# Altium footprint library PCB_Library.PcbLib: 110 footprints (part 4 of 7)
Each footprint in its own frame and in the unit in brackets; x right, y up, seen from the top. Pads: shape width x height; smd on the part's side, far side on the other; paste and mask are expansions set on the pad; w line width, h text height; cw(c..) or ccw(c..) is an arc to the next point about the centre after c.
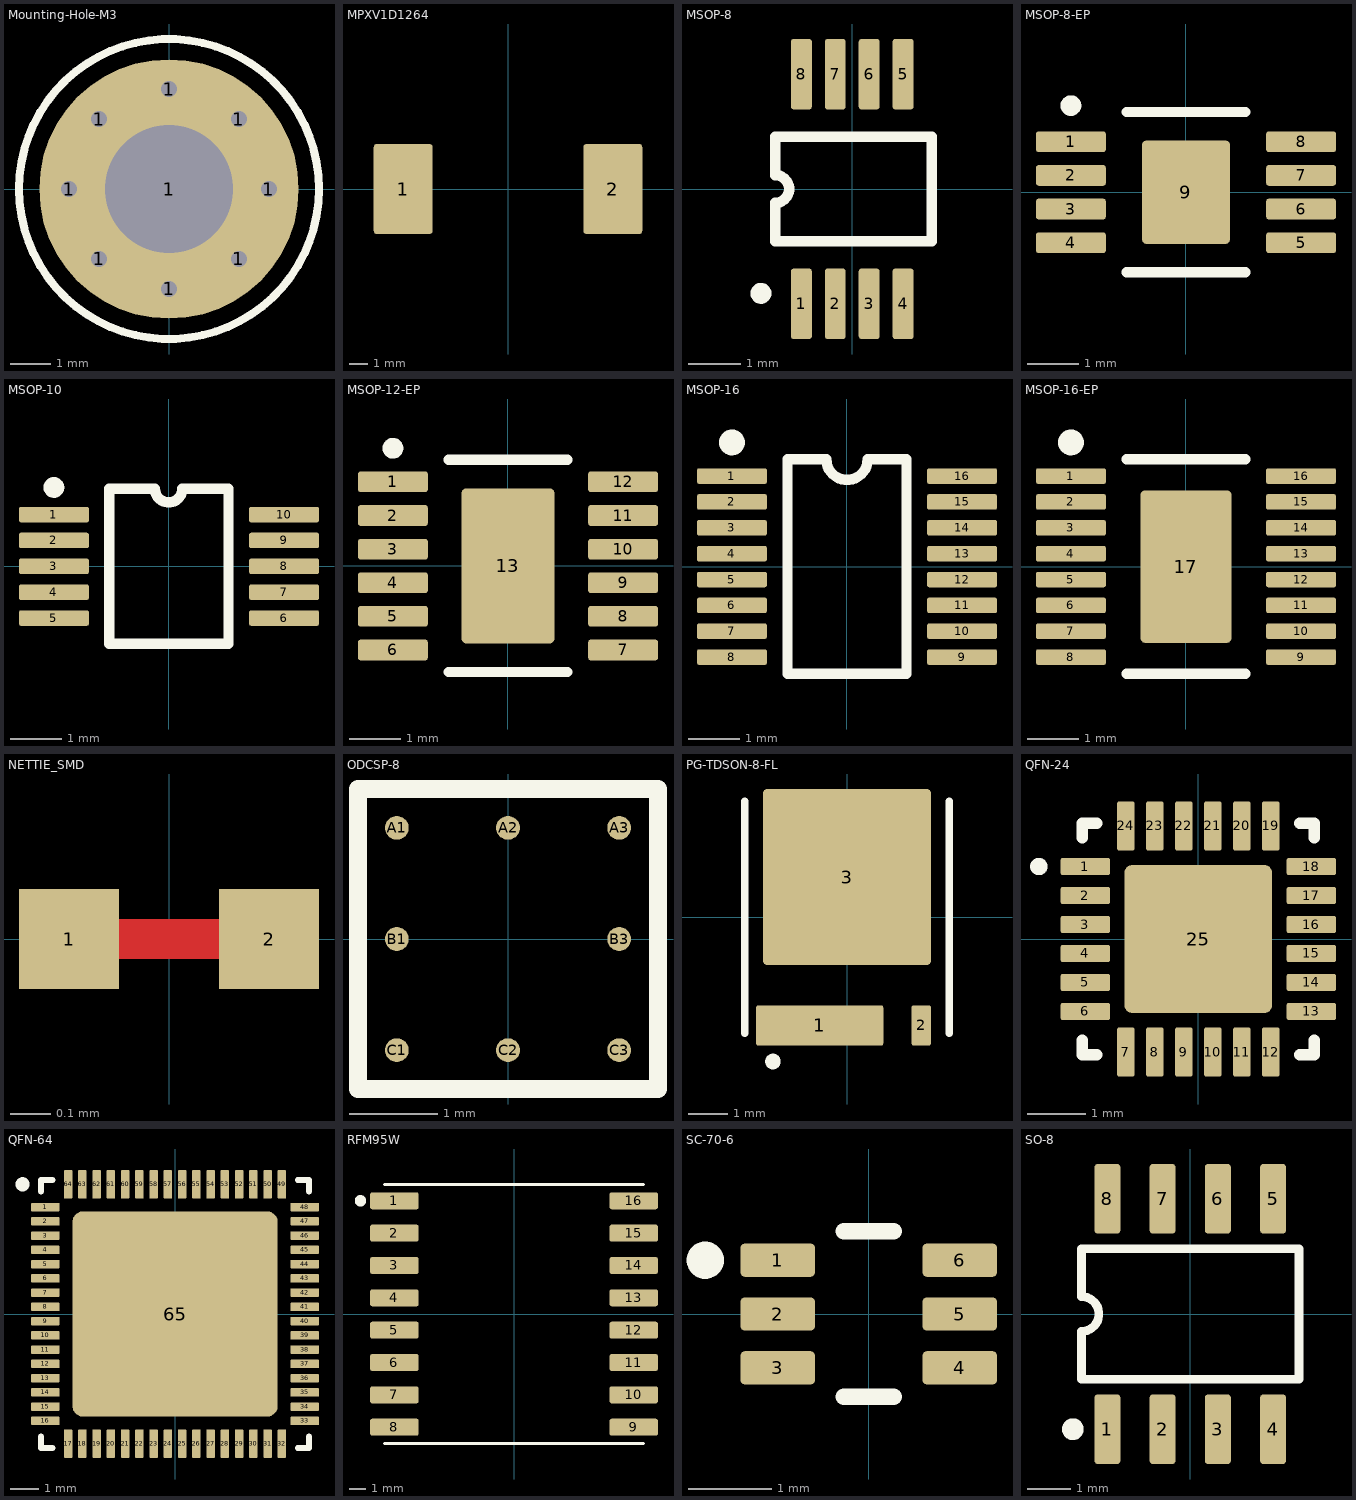
[diagram p3: the footprints below, top view; thin cyan lines are the x and y axes]

## Mounting-Hole-M3 [mm]
pads (9):
  round 1 hole 0.4 mask+0: 1(-2.5,0) 1(-1.75,-1.75) 1(-1.75,1.75) 1(0,-2.5) 1(0,2.5) 1(1.75,-1.75) 1(1.75,1.75) 1(2.5,0)
  round 6.5 hole 3.2 mask+0.05: 1(0,0)
Top Overlay:
  circle w0.2: c0,0 r3.758
Bottom Overlay:
  circle w0.2: c0,0 r3.758

## MPXV1D1264 [mil]
pads (2):
  rrect10% 127.01x195 smd paste-78.74 mask+2.95: 1(-226.5,0) 2(226.5,0)
Top Paste:
  rectangle: 177.17,-88.58 275.59,-19.68
  rectangle: 177.17,19.68 275.59,88.58
  rectangle: -275.59,-88.58 -177.17,-19.68
  rectangle: -275.59,19.68 -177.17,88.58
3D body "MPXV1D1264LR68.step": height 254.86, standoff 0.5, extent -267.72,-250 267.72,250

## MSOP-8 [mm]
pads (8):
  rrect25% 0.4x1.35 smd paste-0.05 mask+0.05: 1(-0.975,-2.2) 2(-0.325,-2.2) 3(0.325,-2.2) 4(0.975,-2.2) 5(0.975,2.2) 6(0.325,2.2) 7(-0.325,2.2) 8(-0.975,2.2)
Top Overlay:
  circle w0.2: c-1.75,-2 r0.1
  lines w0.2: -1.475,-1 1.525,-1 1.525,1 -1.475,1 -1.475,0.265 cw(c-1.475,0) -1.475,-0.265 -1.475,-1
3D body "MSOP-8.step": height 1.1, standoff 0, extent -1.6,-2.45 1.6,2.45

## MSOP-8-EP [mm]
height 1.1
pads (9):
  rrect25% 1.35x0.4 smd paste-0.05 mask+0.05: 1(-2.225,0.975) 2(-2.225,0.325) 3(-2.225,-0.325) 4(-2.225,-0.975) 5(2.225,-0.975) 6(2.225,-0.325) 7(2.225,0.325) 8(2.225,0.975)
  rrect10% 1.7x2 smd paste-0.05 mask+0.05: 9(0,0)
Top Overlay:
  circle w0.2: c-2.225,1.675 r0.1
  lines w0.2: -1.15,-1.55 1.15,-1.55 ; -1.15,1.55 1.15,1.55
3D body "User Library-EMSOP-8 Natl Semi MUY08A.step": height 1.09, standoff -0.01, extent -2.5,-1.5 2.5,1.5

## MSOP-10 [mm]
height 1.1
pads (10):
  rrect25% 1.35x0.3 smd paste-0.05 mask+0.05: 1(-2.225,1) 2(-2.225,0.5) 3(-2.225,0) 4(-2.225,-0.5) 5(-2.225,-1) 6(2.225,-1) 7(2.225,-0.5) 8(2.225,0) 9(2.225,0.5) 10(2.225,1)
Top Overlay:
  circle w0.2: c-2.225,1.525 r0.1
  lines w0.2: -1.157,-1.5 1.15,-1.5 1.15,1.493 1.143,1.5 0.257,1.5 cw(c-0.007,1.5) -0.272,1.5 -1.157,1.5 -1.157,-1.5
3D body "User Library-MSOP 10 LDS.step": height 1.15, standoff 0, extent -2.45,-1.5 2.45,1.5

## MSOP-12-EP [mm]
height 1.1
pads (13):
  rrect25% 1.35x0.4 smd paste-0.05 mask+0.05: 1(-2.225,1.625) 2(-2.225,0.975) 3(-2.225,0.325) 4(-2.225,-0.325) 5(-2.225,-0.975) 6(-2.225,-1.625) 7(2.225,-1.625) 8(2.225,-0.975) 9(2.225,-0.325) 10(2.225,0.325) 11(2.225,0.975) 12(2.225,1.625)
  rrect10% 1.8x3 smd paste-3 mask+0.05: 13(0,0)
Top Overlay:
  circle w0.2: c-2.225,2.275 r0.1
  lines w0.2: -1.15,-2.05 1.15,-2.05 ; -1.15,2.05 1.15,2.05
Top Paste:
  rectangle: -0.8,-1.4 0.8,-0.3
  rectangle: -0.8,0.3 0.8,1.4
3D body "User Library-MSOP12-EP.step": height 0.98, standoff 0, extent -2.45,-2.02 2.45,2.02

## MSOP-16 [mm]
height 1.1
pads (16):
  rrect25% 1.35x0.3 smd paste-0.025 mask+0.05: 1(-2.225,1.75) 2(-2.225,1.25) 3(-2.225,0.75) 4(-2.225,0.25) 5(-2.225,-0.25) 6(-2.225,-0.75) 7(-2.225,-1.25) 8(-2.225,-1.75) 9(2.225,-1.75) 10(2.225,-1.25) 11(2.225,-0.75) 12(2.225,-0.25) 13(2.225,0.25) 14(2.225,0.75) 15(2.225,1.25) 16(2.225,1.75)
Top Overlay:
  circle w0.25: c-2.225,2.4 r0.125
  lines w0.2: -1.15,-2.075 1.15,-2.075 1.15,2.075 0.4,2.075 cw(c0,2.075) -0.4,2.075 -1.15,2.075 -1.15,-2.075
3D body "IC_Analog_Devices_LTC2376IMS-16#PBF_eec.STEP": height 0.25, standoff 0, extent -2.78,-2.12 2.78,2.119

## MSOP-16-EP [mm]
height 1.1
pads (17):
  rrect25% 1.35x0.3 smd paste-0.025 mask+0.05: 1(-2.225,1.75) 2(-2.225,1.25) 3(-2.225,0.75) 4(-2.225,0.25) 5(-2.225,-0.25) 6(-2.225,-0.75) 7(-2.225,-1.25) 8(-2.225,-1.75) 9(2.225,-1.75) 10(2.225,-1.25) 11(2.225,-0.75) 12(2.225,-0.25) 13(2.225,0.25) 14(2.225,0.75) 15(2.225,1.25) 16(2.225,1.75)
  rrect10% 1.76x2.95 smd paste-0.15 mask+0.05: 17(0,0)
Top Overlay:
  circle w0.25: c-2.225,2.4 r0.125
  lines w0.2: -1.15,-2.075 1.15,-2.075 ; -1.15,2.075 1.15,2.075
3D body "User Library-LTC7000_2.step": height 0.86, standoff 0, extent -2.45,-2.02 2.45,2.02

## NETTIE_SMD [mm]
pads (2):
  rect 0.25x0.25 smd paste-1 mask-1: 1(-0.25,0) 2(0.25,0)
Top Layer:
  rectangle: -0.15,-0.05 0.15,0.05

## ODCSP-8 [mm]
height 0.69
pads (8):
  round 0.27 smd mask+0.05: A1(-1.26,1.26) A2(0,1.26) A3(1.26,1.26) B1(-1.26,0) B3(1.26,0) C1(-1.26,-1.26) C2(0,-1.26) C3(1.26,-1.26)
Top Overlay:
  lines w0.2: -1.7,-1.7 1.7,-1.7 1.7,1.7 -1.7,1.7 -1.7,-1.7
3D body "ODCSP-8.step": height 0.69, standoff 0, extent -1.58,-1.58 1.58,1.58

## PG-TDSON-8-FL [mm]
pads (3):
  rrect10% 3.26x1.035 smd paste-1 mask+0.05: 1(-0.7,-2.775)
  rrect25% 0.5x1.035 smd paste-1 mask+0.05: 2(1.905,-2.775)
  rrect5% 4.31x4.515 smd paste-5 mask+0.05: 3(0,1.033)
Top Overlay:
  circle w0.2: c-1.9,-3.7 r0.1
  lines w0.2: -2.625,-2.975 -2.625,2.975 ; 2.625,-2.975 2.625,2.975
Top Paste:
  rectangle: 1.705,-3.24 2.105,-2.46
  rectangle: -2.28,-2.74 -1.36,-2.3
  rectangle: -1.16,-2.74 -0.24,-2.3
  rectangle: -0.04,-2.74 0.88,-2.3
  rectangle: -2.105,-3.24 -1.705,-2.94
  rectangle: -0.835,-3.24 -0.435,-2.94
  rectangle: 0.435,-3.24 0.835,-2.94
  rectangle: 0.1,0.625 1.6,2.025
  rectangle: -1.6,0.625 -0.1,2.025
  rectangle: -1.6,-0.975 -0.1,0.425
  rectangle: 0.1,-0.975 1.6,0.425
  rectangle: -2.105,2.498 -1.705,3.242
  rectangle: -0.835,2.498 -0.435,3.242
  rectangle: 0.435,2.498 0.835,3.242
  rectangle: 1.705,2.498 2.105,3.242
3D body "Infineon-STP_PG-TDSON-8-17-P-v01_00-EN.stp": height 1.01, standoff 0, extent -2.575,-3.075 2.575,3.075

## QFN-24 [mm]
pads (25):
  rrect25% 0.85x0.3 smd paste-0.05 mask+0.05: 1(-1.95,1.25) 2(-1.95,0.75) 3(-1.95,0.25) 4(-1.95,-0.25) 5(-1.95,-0.75) 6(-1.95,-1.25) 13(1.95,-1.25) 14(1.95,-0.75) 15(1.95,-0.25) 16(1.95,0.25) 17(1.95,0.75) 18(1.95,1.25)
  rrect25% 0.3x0.85 smd paste-0.05 mask+0.05: 7(-1.25,-1.95) 8(-0.75,-1.95) 9(-0.25,-1.95) 10(0.25,-1.95) 11(0.75,-1.95) 12(1.25,-1.95) 19(1.25,1.95) 20(0.75,1.95) 21(0.25,1.95) 22(-0.25,1.95) 23(-0.75,1.95) 24(-1.25,1.95)
  rrect10% 2.55x2.55 smd paste-2 mask+0.05: 25(0,0)
Top Overlay:
  circle w0.2: c-2.75,1.25 r0.05
  lines w0.2: -2,-1.75 -2,-2 -1.75,-2 ; -2,1.75 -2,2 -1.75,2 ; 1.75,-2 2,-2 2,-1.75 ; 1.75,2 2,2 2,1.75
Top Paste:
  rectangle: 0.1,0.1 1.1,1.1
  rectangle: 0.1,-1.1 1.1,-0.1
  rectangle: -1.1,-1.1 -0.1,-0.1
  rectangle: -1.1,0.1 -0.1,1.1
3D body "IC_Silicon_Labs_CP2102N-A02-GQFN24_eec.STEP": height 0.8, standoff 0, extent -2.001,-2.001 2.001,2.001

## QFN-64 [mm]
height 0.8
pads (65):
  rrect25% 1x0.3 smd paste-0.05 mask+0.05: 1(-4.55,3.75) 2(-4.55,3.25) 3(-4.55,2.75) 4(-4.55,2.25) 5(-4.55,1.75) 6(-4.55,1.25) 7(-4.55,0.75) 8(-4.55,0.25) 9(-4.55,-0.25) 10(-4.55,-0.75) 11(-4.55,-1.25) 12(-4.55,-1.75) 13(-4.55,-2.25) 14(-4.55,-2.75) 15(-4.55,-3.25) 16(-4.55,-3.75) 33(4.55,-3.75) 34(4.55,-3.25) 35(4.55,-2.75) 36(4.55,-2.25) 37(4.55,-1.75) 38(4.55,-1.25) 39(4.55,-0.75) 40(4.55,-0.25) 41(4.55,0.25) 42(4.55,0.75) 43(4.55,1.25) 44(4.55,1.75) 45(4.55,2.25) 46(4.55,2.75) 47(4.55,3.25) 48(4.55,3.75)
  rrect25% 0.3x1 smd paste-0.05 mask+0.05: 17(-3.75,-4.55) 18(-3.25,-4.55) 19(-2.75,-4.55) 20(-2.25,-4.55) 21(-1.75,-4.55) 22(-1.25,-4.55) 23(-0.75,-4.55) 24(-0.25,-4.55) 25(0.25,-4.55) 26(0.75,-4.55) 27(1.25,-4.55) 28(1.75,-4.55) 29(2.25,-4.55) 30(2.75,-4.55) 31(3.25,-4.55) 32(3.75,-4.55) 49(3.75,4.55) 50(3.25,4.55) 51(2.75,4.55) 52(2.25,4.55) 53(1.75,4.55) 54(1.25,4.55) 55(0.75,4.55) 56(0.25,4.55) 57(-0.25,4.55) 58(-0.75,4.55) 59(-1.25,4.55) 60(-1.75,4.55) 61(-2.25,4.55) 62(-2.75,4.55) 63(-3.25,4.55) 64(-3.75,4.55)
  rrect10% 7.2x7.2 smd paste-4 mask+0.05: 65(0,0)
Top Overlay:
  circle w0.25: c-5.35,4.55 r0.125
  lines w0.2: -4.7,-4.3 -4.7,-4.7 -4.3,-4.7 ; -4.7,4.3 -4.7,4.7 -4.3,4.7 ; 4.3,-4.7 4.7,-4.7 4.7,-4.3 ; 4.3,4.7 4.7,4.7 4.7,4.3
Top Paste:
  rectangle: -3,0.5 -0.5,3
  rectangle: -3,-3 -0.5,-0.5
  rectangle: 0.5,-3 3,-0.5
  rectangle: 0.5,0.5 3,3
3D body "IC_Analog_Devices_LTC2158IUP-14#PBF_eec.STEP": height 0.8, standoff 0, extent -4.5,-4.5 4.5,4.5

## RFM95W [mm]
pads (16):
  rrect25% 3x1.05 smd paste-0.05 mask+0.05: 1(-7.4,7) 2(-7.4,5) 3(-7.4,3) 4(-7.4,1) 5(-7.4,-1) 6(-7.4,-3) 7(-7.4,-5) 8(-7.4,-7) 9(7.4,-7) 10(7.4,-5) 11(7.4,-3) 12(7.4,-1) 13(7.4,1) 14(7.4,3) 15(7.4,5) 16(7.4,7)
Top Overlay:
  circle w0.4: c-9.5,7 r0.15
  lines w0.2: -8,-8 8,-8 ; -8,8 8,8
3D body "User Library-RFM96W.STEP": height 2.24, standoff 0.01, extent -8.002,-7.95 8,7.95

## SC-70-6 [mm]
pads (6):
  rrect25% 0.9x0.4 smd paste-0.05 mask+0.05: 1(-1.1,0.65) 2(-1.1,0) 3(-1.1,-0.65) 4(1.1,-0.65) 5(1.1,0) 6(1.1,0.65)
Top Overlay:
  circle w0.25: c-1.975,0.65 r0.1
  lines w0.2: -0.3,-1 0.3,-1 ; -0.3,1 0.3,1
3D body "IC_Texas_Instruments_INA213AIDCKR_eec.STEP": height 1.1, standoff 0, extent -1.1,-1 1.1,1

## SO-8 [mm]
pads (8):
  rrect25% 0.6x1.6 smd paste-0.05 mask+0.05: 1(-1.905,-2.65) 2(-0.635,-2.65) 3(0.635,-2.65) 4(1.905,-2.65) 5(1.905,2.65) 6(0.635,2.65) 7(-0.635,2.65) 8(-1.905,2.65)
Top Overlay:
  circle w0.25: c-2.7,-2.65 r0.125
  lines w0.2: -2.5,-1.2 -2.5,-1.5 ; -2.5,1.2 -2.5,1.5 ; -2.5,-1.5 2.5,-1.5 2.5,1.5 -2.5,1.5 ; -2.5,-1.5 -2.5,-0.4 ccw(c-2.5,0) -2.5,0.4 -2.5,1.5
3D body "SOIC127P600X175-8N.step": height 1.75, standoff 0, extent -2.5,-3 2.5,3